# Altium footprint library SMDLibrary.PcbLib: 309 footprints (part 9 of 20)
Each footprint in its own frame and in the unit in brackets; x right, y up, seen from the top. Pads: shape width x height; smd on the part's side, far side on the other; paste and mask are expansions set on the pad; w line width, h text height; cw(c..) or ccw(c..) is an arc to the next point about the centre after c.
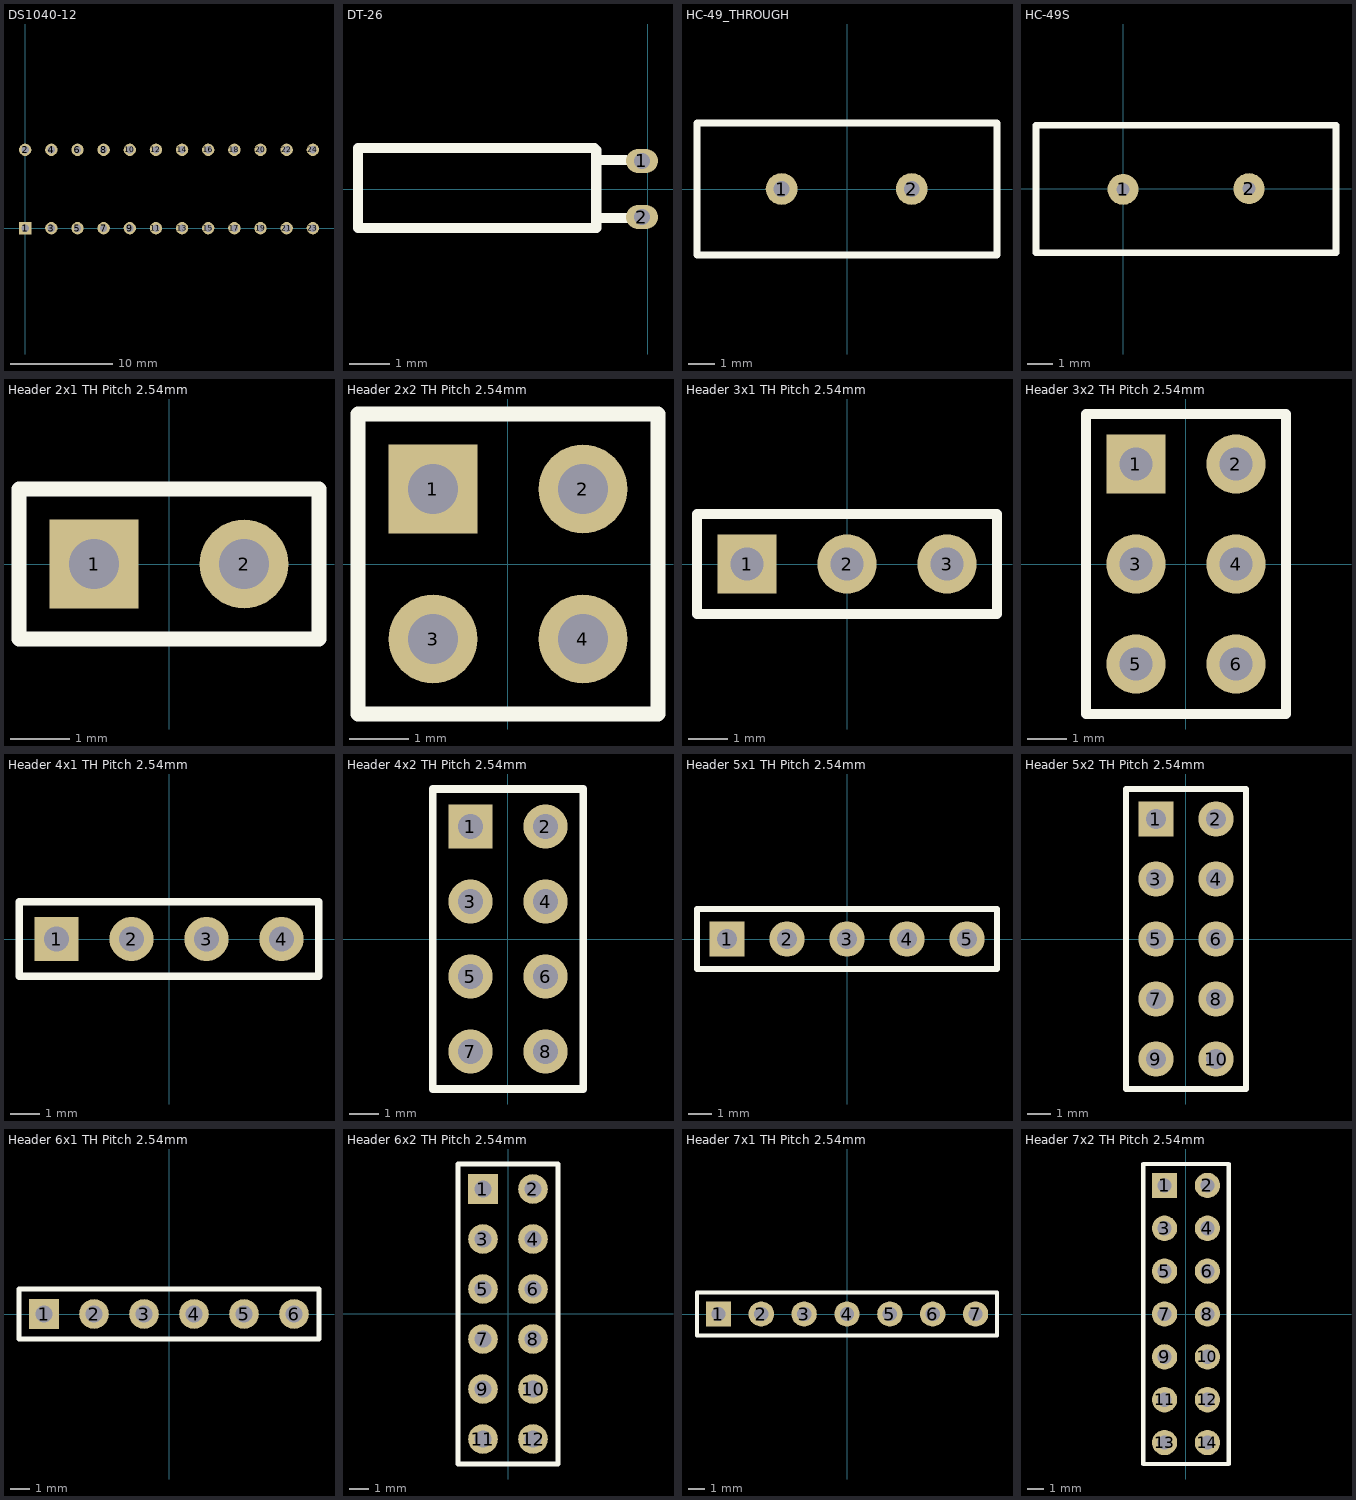
[diagram p8: the footprints below, top view; thin cyan lines are the x and y axes]

## DS1040-12 [mm]
pads (24):
  rect 1.2x1.2 hole 0.7: 1(0,0)
  round 1.2 hole 0.7: 2(0,7.62) 3(2.54,0) 4(2.54,7.62) 5(5.08,0) 6(5.08,7.62) 7(7.62,0) 8(7.62,7.62) 9(10.16,0) 10(10.16,7.62) 11(12.7,0) 12(12.7,7.62) 13(15.24,0) 14(15.24,7.62) 15(17.78,0) 16(17.78,7.62) 17(20.32,0) 18(20.32,7.62) 19(22.86,0) 20(22.86,7.62) 21(25.4,0) 22(25.4,7.62) 23(27.94,0) 24(27.94,7.62)
3D body "DS1040-12 (DIP_switch).stp": height 6.8, standoff -3.85, extent -2,-1.14 29.94,8.76

## DT-26 [mm]
pads (2):
  oval 0.8x0.6 hole 0.4: 1(-0.15,0.7) 2(-0.15,-0.7)
Top Overlay:
  lines w0.254: -1.265,0.725 -0.565,0.725 ; -1.24,-0.725 -0.54,-0.725 ; -7.24,-0.975 -1.34,-0.975 -1.29,-0.975 -1.29,0.975 -1.34,1.025 -7.24,1.025 -7.24,-0.975
3D body "User Library-DT-26-1.STEP": height 2, standoff -2, extent -7.14,-1 0,1

## HC-49_THROUGH [mm]
pads (2):
  round 1.2 hole 0.6: 1(-2.475,0) 2(2.45,0)
Top Overlay:
  lines w0.254: -5.675,-2.5 5.675,-2.5 5.675,2.5 -5.675,2.5 -5.675,-2.5
3D body "xtalcrystal.SLDPRT": height 3.68, standoff -13.2, extent -5.675,-2.5 5.675,2.5

## HC-49S [mm]
pads (2):
  round 1.2 hole 0.5: 1(0,-0.025) 2(4.88,0)
Top Overlay:
  lines w0.254: -3.375,-2.475 -3.375,2.45 8.25,2.45 8.25,-2.475 -3.375,-2.475
3D body "SW3dPS-HP49US.STEP": height 3.5, standoff -4, extent -3.235,-2.325 8.115,2.325

## Header 2x1 TH Pitch 2.54mm [mm]
pads (2):
  rect 1.5x1.5 hole 0.85: 1(-1.27,0)
  round 1.5 hole 0.85: 2(1.27,0)
Top Overlay:
  lines w0.254: -2.54,-1.27 2.54,-1.27 2.54,1.27 -2.54,1.27 -2.54,-1.27
3D body "zl201-1_p2-54_l2-54_w2-54_h8-89.stp": height 8.89, standoff -3.05, extent -2.54,-1.27 0,1.27
3D body "zl201-1_p2-54_l2-54_w2-54_h8-89.stp": height 8.89, standoff -3.05, extent 0,-1.27 2.54,1.27

## Header 2x2 TH Pitch 2.54mm [mm]
pads (4):
  rect 1.5x1.5 hole 0.85: 1(-1.27,1.27)
  round 1.5 hole 0.85: 2(1.27,1.27) 3(-1.27,-1.27) 4(1.27,-1.27)
Top Overlay:
  lines w0.254: -2.54,-2.54 -2.54,2.54 2.54,2.54 2.54,-2.54 -2.54,-2.54
3D body "zl201-1_p2-54_l2-54_w2-54_h8-89.stp": height 8.89, standoff -3.05, extent -2.54,0 0,2.54
3D body "zl201-1_p2-54_l2-54_w2-54_h8-89.stp": height 8.89, standoff -3.05, extent 0,0 2.54,2.54
3D body "zl201-1_p2-54_l2-54_w2-54_h8-89.stp": height 8.89, standoff -3.05, extent -2.54,-2.54 0,0
3D body "zl201-1_p2-54_l2-54_w2-54_h8-89.stp": height 8.89, standoff -3.05, extent 0,-2.54 2.54,0

## Header 3x1 TH Pitch 2.54mm [mm]
pads (3):
  rect 1.5x1.5 hole 0.85: 1(-2.54,0)
  round 1.5 hole 0.85: 2(0,0) 3(2.54,0)
Top Overlay:
  lines w0.254: -3.81,-1.27 3.81,-1.27 3.81,1.27 -3.81,1.27 -3.81,-1.27
3D body "zl201-1_p2-54_l2-54_w2-54_h8-89.stp": height 8.89, standoff -3.05, extent 1.27,-1.27 3.81,1.27
3D body "zl201-1_p2-54_l2-54_w2-54_h8-89.stp": height 8.89, standoff -3.05, extent -1.27,-1.27 1.27,1.27
3D body "zl201-1_p2-54_l2-54_w2-54_h8-89.stp": height 8.89, standoff -3.05, extent -3.81,-1.27 -1.27,1.27

## Header 3x2 TH Pitch 2.54mm [mm]
pads (6):
  rect 1.5x1.5 hole 0.85: 1(-1.27,2.54)
  round 1.5 hole 0.85: 2(1.27,2.54) 3(-1.27,0) 4(1.27,0) 5(-1.27,-2.54) 6(1.27,-2.54)
Top Overlay:
  lines w0.254: -2.54,-3.81 2.54,-3.81 2.54,3.81 -2.54,3.81 ; -2.54,-3.809 -2.54,3.81 ; -2.54,-3.809 -2.54,-3.81 ; -2.54,3.81 -2.54,3.81
3D body "zl201-1_p2-54_l2-54_w2-54_h8-89.stp": height 8.89, standoff -3.05, extent 0,-3.81 2.54,-1.27
3D body "zl201-1_p2-54_l2-54_w2-54_h8-89.stp": height 8.89, standoff -3.05, extent -2.54,-3.809 0,-1.269
3D body "zl201-1_p2-54_l2-54_w2-54_h8-89.stp": height 8.89, standoff -3.05, extent 0,-1.27 2.54,1.27
3D body "zl201-1_p2-54_l2-54_w2-54_h8-89.stp": height 8.89, standoff -3.05, extent -2.54,-1.27 0,1.27
3D body "zl201-1_p2-54_l2-54_w2-54_h8-89.stp": height 8.89, standoff -3.05, extent 0,1.27 2.54,3.81
3D body "zl201-1_p2-54_l2-54_w2-54_h8-89.stp": height 8.89, standoff -3.05, extent -2.54,1.27 0,3.81

## Header 4x1 TH Pitch 2.54mm [mm]
pads (4):
  rect 1.5x1.5 hole 0.85: 1(-3.81,0)
  round 1.5 hole 0.85: 2(-1.27,0) 3(1.27,0) 4(3.81,0)
Top Overlay:
  lines w0.254: -5.08,-1.27 -5.08,1.27 5.08,1.27 5.08,-1.27 -5.08,-1.27
3D body "zl201-1_p2-54_l2-54_w2-54_h8-89.stp": height 8.89, standoff -3.05, extent -5.08,-1.27 -2.54,1.27
3D body "zl201-1_p2-54_l2-54_w2-54_h8-89.stp": height 8.89, standoff -3.05, extent -2.54,-1.27 0,1.27
3D body "zl201-1_p2-54_l2-54_w2-54_h8-89.stp": height 8.89, standoff -3.05, extent 0,-1.27 2.54,1.27
3D body "zl201-1_p2-54_l2-54_w2-54_h8-89.stp": height 8.89, standoff -3.05, extent 2.54,-1.27 5.08,1.27

## Header 4x2 TH Pitch 2.54mm [mm]
pads (8):
  rect 1.5x1.5 hole 0.85: 1(-1.27,3.81)
  round 1.5 hole 0.85: 2(1.27,3.81) 3(-1.27,1.27) 4(1.27,1.27) 5(-1.27,-1.27) 6(1.27,-1.27) 7(-1.27,-3.81) 8(1.27,-3.81)
Top Overlay:
  lines w0.254: -2.54,-5.08 -2.54,5.08 2.54,5.08 2.54,-5.08 -2.54,-5.08
3D body "zl201-1_p2-54_l2-54_w2-54_h8-89.stp": height 8.89, standoff -3.05, extent -2.54,2.54 0,5.08
3D body "zl201-1_p2-54_l2-54_w2-54_h8-89.stp": height 8.89, standoff -3.05, extent 0,2.54 2.54,5.08
3D body "zl201-1_p2-54_l2-54_w2-54_h8-89.stp": height 8.89, standoff -3.05, extent -2.54,0 0,2.54
3D body "zl201-1_p2-54_l2-54_w2-54_h8-89.stp": height 8.89, standoff -3.05, extent 0,0 2.54,2.54
3D body "zl201-1_p2-54_l2-54_w2-54_h8-89.stp": height 8.89, standoff -3.05, extent -2.54,-2.539 0,0.001
3D body "zl201-1_p2-54_l2-54_w2-54_h8-89.stp": height 8.89, standoff -3.05, extent -2.54,-5.08 0,-2.54
3D body "zl201-1_p2-54_l2-54_w2-54_h8-89.stp": height 8.89, standoff -3.05, extent 0,-2.54 2.54,0
3D body "zl201-1_p2-54_l2-54_w2-54_h8-89.stp": height 8.89, standoff -3.05, extent 0,-5.08 2.54,-2.54

## Header 5x1 TH Pitch 2.54mm [mm]
pads (5):
  rect 1.5x1.5 hole 0.85: 1(-5.08,0)
  round 1.5 hole 0.85: 2(-2.54,0) 3(0,0) 4(2.54,0) 5(5.08,0)
Top Overlay:
  lines w0.254: -6.35,-1.27 6.35,-1.27 6.35,1.27 -6.35,1.27 -6.35,-1.27
3D body "zl201-1_p2-54_l2-54_w2-54_h8-89.stp": height 8.89, standoff -3.05, extent -6.35,-1.27 -3.81,1.27
3D body "zl201-1_p2-54_l2-54_w2-54_h8-89.stp": height 8.89, standoff -3.05, extent -3.81,-1.27 -1.27,1.27
3D body "zl201-1_p2-54_l2-54_w2-54_h8-89.stp": height 8.89, standoff -3.05, extent -1.27,-1.27 1.27,1.27
3D body "zl201-1_p2-54_l2-54_w2-54_h8-89.stp": height 8.89, standoff -3.05, extent 1.27,-1.27 3.81,1.27
3D body "zl201-1_p2-54_l2-54_w2-54_h8-89.stp": height 8.89, standoff -3.05, extent 3.81,-1.27 6.35,1.27

## Header 5x2 TH Pitch 2.54mm [mm]
pads (10):
  rect 1.5x1.5 hole 0.85: 1(-1.27,5.08)
  round 1.5 hole 0.85: 2(1.27,5.08) 3(-1.27,2.54) 4(1.27,2.54) 5(-1.27,0) 6(1.27,0) 7(-1.27,-2.54) 8(1.27,-2.54) 9(-1.27,-5.08) 10(1.27,-5.08)
Top Overlay:
  lines w0.254: -2.54,-6.35 -2.54,6.35 2.54,6.35 2.54,-6.35 -2.54,-6.35
3D body "zl201-1_p2-54_l2-54_w2-54_h8-89.stp": height 8.89, standoff -3.05, extent -2.54,3.81 0,6.35
3D body "zl201-1_p2-54_l2-54_w2-54_h8-89.stp": height 8.89, standoff -3.05, extent 0,3.81 2.54,6.35
3D body "zl201-1_p2-54_l2-54_w2-54_h8-89.stp": height 8.89, standoff -3.05, extent -2.54,1.27 0,3.81
3D body "zl201-1_p2-54_l2-54_w2-54_h8-89.stp": height 8.89, standoff -3.05, extent 0,1.27 2.54,3.81
3D body "zl201-1_p2-54_l2-54_w2-54_h8-89.stp": height 8.89, standoff -3.05, extent -2.54,-1.269 0,1.271
3D body "zl201-1_p2-54_l2-54_w2-54_h8-89.stp": height 8.89, standoff -3.05, extent -2.54,-3.81 0,-1.27
3D body "zl201-1_p2-54_l2-54_w2-54_h8-89.stp": height 8.89, standoff -3.05, extent -2.54,-6.35 0,-3.81
3D body "zl201-1_p2-54_l2-54_w2-54_h8-89.stp": height 8.89, standoff -3.05, extent 0,-1.27 2.54,1.27
3D body "zl201-1_p2-54_l2-54_w2-54_h8-89.stp": height 8.89, standoff -3.05, extent 0,-3.81 2.54,-1.27
3D body "zl201-1_p2-54_l2-54_w2-54_h8-89.stp": height 8.89, standoff -3.05, extent 0,-6.35 2.54,-3.81

## Header 6x1 TH Pitch 2.54mm [mm]
pads (6):
  rect 1.5x1.5 hole 0.85: 1(-6.35,0)
  round 1.5 hole 0.85: 2(-3.81,0) 3(-1.27,0) 4(1.27,0) 5(3.81,0) 6(6.35,0)
Top Overlay:
  lines w0.254: -7.62,-1.27 -7.62,1.27 7.62,1.27 7.62,-1.27 -7.62,-1.27
3D body "zl201-1_p2-54_l2-54_w2-54_h8-89.stp": height 8.89, standoff -3.05, extent 5.08,-1.27 7.62,1.27
3D body "zl201-1_p2-54_l2-54_w2-54_h8-89.stp": height 8.89, standoff -3.05, extent 2.54,-1.27 5.08,1.27
3D body "zl201-1_p2-54_l2-54_w2-54_h8-89.stp": height 8.89, standoff -3.05, extent 0,-1.27 2.54,1.27
3D body "zl201-1_p2-54_l2-54_w2-54_h8-89.stp": height 8.89, standoff -3.05, extent -2.54,-1.27 0,1.27
3D body "zl201-1_p2-54_l2-54_w2-54_h8-89.stp": height 8.89, standoff -3.05, extent -5.08,-1.27 -2.54,1.27
3D body "zl201-1_p2-54_l2-54_w2-54_h8-89.stp": height 8.89, standoff -3.05, extent -7.62,-1.27 -5.08,1.27

## Header 6x2 TH Pitch 2.54mm [mm]
pads (12):
  rect 1.5x1.5 hole 0.85: 1(-1.27,6.35)
  round 1.5 hole 0.85: 2(1.27,6.35) 3(-1.27,3.81) 4(1.27,3.81) 5(-1.27,1.27) 6(1.27,1.27) 7(-1.27,-1.27) 8(1.27,-1.27) 9(-1.27,-3.81) 10(1.27,-3.81) 11(-1.27,-6.35) 12(1.27,-6.35)
Top Overlay:
  lines w0.254: -2.54,-7.62 -2.54,7.62 2.54,7.62 2.54,-7.62 -2.54,-7.62
3D body "zl201-1_p2-54_l2-54_w2-54_h8-89.stp": height 8.89, standoff -3.05, extent -2.54,5.08 0,7.62
3D body "zl201-1_p2-54_l2-54_w2-54_h8-89.stp": height 8.89, standoff -3.05, extent 0,5.08 2.54,7.62
3D body "zl201-1_p2-54_l2-54_w2-54_h8-89.stp": height 8.89, standoff -3.05, extent -2.54,2.54 0,5.08
3D body "zl201-1_p2-54_l2-54_w2-54_h8-89.stp": height 8.89, standoff -3.05, extent 0,2.54 2.54,5.08
3D body "zl201-1_p2-54_l2-54_w2-54_h8-89.stp": height 8.89, standoff -3.05, extent -2.54,0 0,2.54
3D body "zl201-1_p2-54_l2-54_w2-54_h8-89.stp": height 8.89, standoff -3.05, extent -2.54,-2.54 0,0
3D body "zl201-1_p2-54_l2-54_w2-54_h8-89.stp": height 8.89, standoff -3.05, extent -2.54,-5.08 0,-2.54
3D body "zl201-1_p2-54_l2-54_w2-54_h8-89.stp": height 8.89, standoff -3.05, extent -2.54,-7.62 0,-5.08
3D body "zl201-1_p2-54_l2-54_w2-54_h8-89.stp": height 8.89, standoff -3.05, extent 0,0 2.54,2.54
3D body "zl201-1_p2-54_l2-54_w2-54_h8-89.stp": height 8.89, standoff -3.05, extent 0,-2.54 2.54,0
3D body "zl201-1_p2-54_l2-54_w2-54_h8-89.stp": height 8.89, standoff -3.05, extent 0,-5.08 2.54,-2.54
3D body "zl201-1_p2-54_l2-54_w2-54_h8-89.stp": height 8.89, standoff -3.05, extent 0,-7.62 2.54,-5.08

## Header 7x1 TH Pitch 2.54mm [mm]
pads (7):
  rect 1.5x1.5 hole 0.85: 1(-7.62,0)
  round 1.5 hole 0.85: 2(-5.08,0) 3(-2.54,0) 4(0,0) 5(2.54,0) 6(5.08,0) 7(7.62,0)
Top Overlay:
  lines w0.254: -8.89,-1.27 8.89,-1.27 8.89,1.27 -8.89,1.27 -8.89,-1.27
3D body "zl201-1_p2-54_l2-54_w2-54_h8-89.stp": height 8.89, standoff -3.05, extent -8.89,-1.27 -6.35,1.27
3D body "zl201-1_p2-54_l2-54_w2-54_h8-89.stp": height 8.89, standoff -3.05, extent -6.35,-1.27 -3.81,1.27
3D body "zl201-1_p2-54_l2-54_w2-54_h8-89.stp": height 8.89, standoff -3.05, extent -3.81,-1.27 -1.27,1.27
3D body "zl201-1_p2-54_l2-54_w2-54_h8-89.stp": height 8.89, standoff -3.05, extent -1.27,-1.27 1.27,1.27
3D body "zl201-1_p2-54_l2-54_w2-54_h8-89.stp": height 8.89, standoff -3.05, extent 1.27,-1.27 3.81,1.27
3D body "zl201-1_p2-54_l2-54_w2-54_h8-89.stp": height 8.89, standoff -3.05, extent 3.81,-1.27 6.35,1.27
3D body "zl201-1_p2-54_l2-54_w2-54_h8-89.stp": height 8.89, standoff -3.05, extent 6.35,-1.27 8.89,1.27

## Header 7x2 TH Pitch 2.54mm [mm]
pads (14):
  rect 1.5x1.5 hole 0.85: 1(-1.27,7.62)
  round 1.5 hole 0.85: 2(1.27,7.62) 3(-1.27,5.08) 4(1.27,5.08) 5(-1.27,2.54) 6(1.27,2.54) 7(-1.27,0) 8(1.27,0) 9(-1.27,-2.54) 10(1.27,-2.54) 11(-1.27,-5.08) 12(1.27,-5.08) 13(-1.27,-7.62) 14(1.27,-7.62)
Top Overlay:
  lines w0.254: 2.54,-8.889 2.54,8.89 -2.54,8.89 -2.54,-8.89 2.54,-8.89 ; 2.54,-8.889 2.54,-8.89
3D body "zl201-1_p2-54_l2-54_w2-54_h8-89.stp": height 8.89, standoff -3.05, extent -2.54,6.35 0,8.89
3D body "zl201-1_p2-54_l2-54_w2-54_h8-89.stp": height 8.89, standoff -3.05, extent 0,6.35 2.54,8.89
3D body "zl201-1_p2-54_l2-54_w2-54_h8-89.stp": height 8.89, standoff -3.05, extent -2.54,3.81 0,6.35
3D body "zl201-1_p2-54_l2-54_w2-54_h8-89.stp": height 8.89, standoff -3.05, extent 0,3.81 2.54,6.35
3D body "zl201-1_p2-54_l2-54_w2-54_h8-89.stp": height 8.89, standoff -3.05, extent -2.54,1.271 0,3.811
3D body "zl201-1_p2-54_l2-54_w2-54_h8-89.stp": height 8.89, standoff -3.05, extent -2.54,-1.27 0,1.27
3D body "zl201-1_p2-54_l2-54_w2-54_h8-89.stp": height 8.89, standoff -3.05, extent -2.54,-3.81 0,-1.27
3D body "zl201-1_p2-54_l2-54_w2-54_h8-89.stp": height 8.89, standoff -3.05, extent -2.54,-6.35 0,-3.81
3D body "zl201-1_p2-54_l2-54_w2-54_h8-89.stp": height 8.89, standoff -3.05, extent -2.54,-8.89 0,-6.35
3D body "zl201-1_p2-54_l2-54_w2-54_h8-89.stp": height 8.89, standoff -3.05, extent 0,1.27 2.54,3.81
3D body "zl201-1_p2-54_l2-54_w2-54_h8-89.stp": height 8.89, standoff -3.05, extent 0,-1.27 2.54,1.27
3D body "zl201-1_p2-54_l2-54_w2-54_h8-89.stp": height 8.89, standoff -3.05, extent 0,-3.81 2.54,-1.27
3D body "zl201-1_p2-54_l2-54_w2-54_h8-89.stp": height 8.89, standoff -3.05, extent 0,-6.35 2.54,-3.81
3D body "zl201-1_p2-54_l2-54_w2-54_h8-89.stp": height 8.89, standoff -3.05, extent 0,-8.89 2.54,-6.35